# Altium integrated library myIOT_lib.IntLib: 300 symbols (part 2 of 3) (continued)
## TXB0104 (continued)

## TXB0108PWR
designator U?
IC TXB0108PWR 8 bits Logic Translator TSSOP-20; Anunda_Code: M1405; Value: TXB0108PWR
footprint TSSOP20
pins: 1 A1 (io), 2 VCCA, 3 A2 (io), 4 A3 (io), 5 A4 (io), 6 A5 (io), 7 A6 (io), 8 A7 (io), 9 A8 (io), 10 OE (in), 11 GND, 12 B8 (io), 13 B7 (io), 14 B6 (io), 15 B5 (io), 16 B4 (io), 17 B3 (io), 18 B2 (io), 19 VCCB, 20 B1 (io)

## TXS0104E
designator U?, comment TXS0104EPWR
TXS0104E 4-Bit Bidirectional Voltage-Level Translator for Open-Drain and Push-Pull / Applications; Anunda_Code: M2024; MFG: Texas Instruments; Value: TXS0104EPWR; MFG P/N: TXS0104EPWR
footprint TSSOP14
pins: 1 VCCA, 2 A1 (io), 3 A2 (io), 4 A3 (io), 5 A4 (io), 6 NC, 7 GND, 8 OE (in), 9 NC, 10 B4 (io), 11 B3 (io), 12 B2 (io), 13 B1 (io), 14 VCCB

## TXS0108EPWR
designator U?
IC TXS0108EPWR 8 bits Logic Translator TSSOP-20; Anunda_Code: M2005; Value: TXS0108EPWR
footprint TSSOP20
pins: 1 A1 (io), 2 VCCA, 3 A2 (io), 4 A3 (io), 5 A4 (io), 6 A5 (io), 7 A6 (io), 8 A7 (io), 9 A8 (io), 10 OE (in), 11 GND, 12 B8 (io), 13 B7 (io), 14 B6 (io), 15 B5 (io), 16 B4 (io), 17 B3 (io), 18 B2 (io), 19 VCCB, 20 B1 (io)

## W25Q16JVSSIQ
designator U?
NOR-SPI Flash Winbond W25Q16JVSSIQ Power Supply 2.7V to 3.6V; Anunda_Code: D1143; MFG: Winbond Electronics; MFG P/N: W25Q16JVSSIQ
footprint SOIC-8_208mil
pins: 1 CS# (in), 2 SO/SIO1 (io), 3 WP#/SIO2 (io), 4 GND, 5 SI/SIO0 (io), 6 SCLK (in), 7 RESET#/SIO3 (io), 8 VCC (power)

## ZED_F9P
designator U?  (value not drawn)
footprint UBlox_ZED
part A pins: 2 RF IN, 4 ANT DETECT (in), 5 ANT OFF (out), 6 ~{ANT SHORT} (in), 19 GEOFENCE STAT (out), 20 RTK STAT (out), 26 RXD2 (in), 27 TXD2 (out), 39 USB DM (io), 40 USB DP (io), 42 TXD/SPI MISO (out), 43 RXD/SPI MOSI (in), 44 SDA/~{SPI CS} (io), 45 SCL/SPI CLK (io), 46 TX READY (out), 47 D SEL (in), 49 ~{RESET} (in), 50 ~{SAFEBOOT} (in), 51 EXTINT (in), 53 TIMEPULSE (out)
part B pins: 7 VCC RF (power), 8 Reserved, 9 Reserved, 10 Reserved, 11 Reserved, 13 Reserved, 15 Reserved, 16 Reserved, 17 Reserved, 18 Reserved, 21 Reserved, 22 Reserved, 23 Reserved, 24 Reserved, 25 Reserved, 28 Reserved, 29 Reserved, 30 Reserved, 31 Reserved, 33 VCC (power), 34 VCC (power), 35 Reserved, 36 V BCKP (power), 38 V USB (power), 52 Reserved, 54 Reserved
part C pins: 1 GND (power), 3 GND (power), 12 GND (power), 14 GND (power), 32 GND (power), 37 GND (power), 41 GND (power), 48 GND (power), 55 GND (power), 56 GND (power), 57 GND (power), 58 GND (power), 59 GND (power), 60 GND (power), 61 GND (power), 62 GND (power), 63 GND (power), 64 GND (power), 65 GND (power), 66 GND (power), 67 GND (power), 68 GND (power), 69 GND (power), 70 GND (power), 71 GND (power), 72 GND (power), 73 GND (power), 74 GND (power), 75 GND (power), 76 GND (power), 77 GND (power), 78 GND (power), 79 GND (power), 80 GND (power), 81 GND (power), 82 GND (power), 83 GND (power), 84 GND (power), 85 GND (power), 86 GND (power), 87 GND (power), 88 GND (power), 89 GND (power), 90 GND (power), 91 GND (power), 92 GND (power), 93 GND (power), 94 GND (power), 95 GND (power), 96 GND (power), 97 GND (power), 98 GND (power), 99 GND (power), 100 GND (power), 101 GND (power), 102 GND (power)


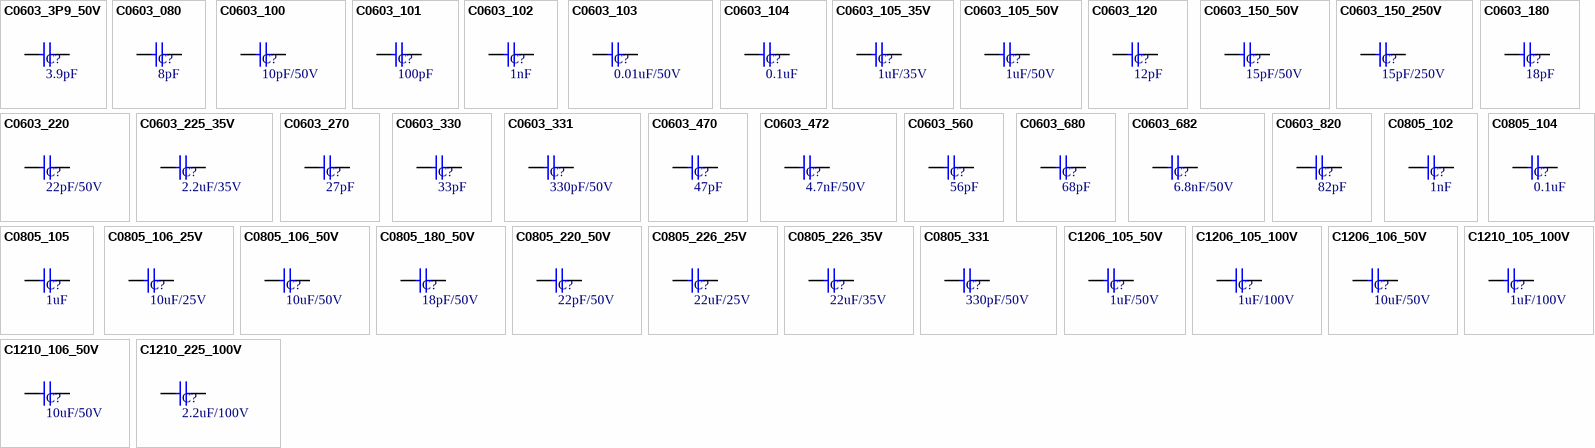
[diagram p12: symbols C0603_3P9_50V to C1210_225_100V]

## C0603_3P9_50V
designator C?, comment 3.9pF
Capacitor 0603 3.9 pF 50V; MFG: Walsin Technology Corporation; MFG P/N: 0603N3R9B500CT; Anunda_Code: M0013; Price: 0.6; Supplier: Digikey; Value: 3.9pF
simulation model CAP (Semiconductor Capacitor)
signal-integrity model Cap Semi
footprint C0603XS (Chip Capacitor; Body 1.6 x 0.8 mm (LxW typ))
pins: 1, 2

## C0603_080
designator C?, comment 8pF
Capacitor 0603 8 pF; MFG: YAGEO; MFG P/N: CC0603DRNPO9BN8R0; Anunda_Code: M1855; Price: 0.6; Supplier: Digikey; Value: 8pF
simulation model CAP (Semiconductor Capacitor)
signal-integrity model Cap Semi
footprint C0603XS (Chip Capacitor; Body 1.6 x 0.8 mm (LxW typ))
pins: 1, 2

## C0603_100
designator C?, comment 10pF/50V
Capacitor 0603 10 pF 50V; MFG: KEMET; MFG P/N: C0603C100J5GAC7867; Anunda_Code: M0615; Price: 0.6; Supplier: Digikey; Value: 10pF/50V
simulation model CAP (Semiconductor Capacitor)
signal-integrity model Cap Semi
footprint C0603XS (Chip Capacitor; Body 1.6 x 0.8 mm (LxW typ))
pins: 1, 2

## C0603_101
designator C?, comment 100pF
Capacitor 0603 100 pF; MFG: TDK Corporation; MFG P/N: C1608C0G1H101J080AA; Anunda_Code: M0016; Price: 0.6; Supplier: Digikey; Value: 100pF
simulation model CAP (Semiconductor Capacitor)
signal-integrity model Cap Semi
footprint C0603XS (Chip Capacitor; Body 1.6 x 0.8 mm (LxW typ))
pins: 1, 2

## C0603_102
designator C?, comment 1nF
Capacitor 0603 1000 pF; MFG: KEMET; MFG P/N: C0603C102J5GAC7867; Anunda_Code: M0617; Price: 0.6; Supplier: Digikey; Value: 1nF
simulation model CAP (Semiconductor Capacitor)
signal-integrity model Cap Semi
footprint C0603XS (Chip Capacitor; Body 1.6 x 0.8 mm (LxW typ))
pins: 1, 2

## C0603_103
designator C?, comment 0.01uF/50V
Capacitor 0603 10000 pF 50V; MFG: YAGEO; MFG P/N: CC0603KRX7R9BB103; Anunda_Code: M0735; Price: 0.6; Supplier: Digikey; Value: 0.01uF/50V
simulation model CAP (Semiconductor Capacitor)
signal-integrity model Cap Semi
footprint C0603XS (Chip Capacitor; Body 1.6 x 0.8 mm (LxW typ))
pins: 1, 2

## C0603_104
designator C?, comment 0.1uF
Capacitor 0603 0.1 uF; MFG: YAGEO; MFG P/N: CC0603ZRY5V9BB104; Anunda_Code: M0020; Price: 0.6; Supplier: Digikey; Value: 0.1uF
simulation model CAP (Semiconductor Capacitor)
signal-integrity model Cap Semi
footprint C0603XS (Chip Capacitor; Body 1.6 x 0.8 mm (LxW typ))
pins: 1, 2

## C0603_105_35V
designator C?, comment 1uF/35V
Capacitor 0603 1 uF 35V X5R; MFG: TDK Corporation; MFG P/N: C1608X5R1V105K080AB; Anunda_Code: M0618; Price: 0.6; Supplier: Digikey; Value: 1uF/35V
simulation model CAP (Semiconductor Capacitor)
signal-integrity model Cap Semi
footprint C0603XS (Chip Capacitor; Body 1.6 x 0.8 mm (LxW typ))
pins: 1, 2

## C0603_105_50V
designator C?, comment 1uF/50V
Capacitor 0603 1 uF 50V X5R; MFG: Murata Electronics; MFG P/N: GRT188R61H105KE13D; Anunda_Code: M1942; Price: 0.6; Supplier: Digikey; Value: 1uF/50V
simulation model CAP (Semiconductor Capacitor)
signal-integrity model Cap Semi
footprint C0603XS (Chip Capacitor; Body 1.6 x 0.8 mm (LxW typ))
pins: 1, 2

## C0603_120
designator C?, comment 12pF
Capacitor 0603 12 pF; MFG: KEMET; MFG P/N: C0603C120J5GAC7867; Anunda_Code: M0015; Price: 0.6; Supplier: Digikey; Value: 12pF
simulation model CAP (Semiconductor Capacitor)
signal-integrity model Cap Semi
footprint C0603XS (Chip Capacitor; Body 1.6 x 0.8 mm (LxW typ))
pins: 1, 2

## C0603_150_50V
designator C?, comment 15pF/50V
Capacitor 0603 15 pF 50V; MFG: YAGEO; MFG P/N: CC0603JRNPO9BN150; Anunda_Code: M1421; Price: 0.6; Supplier: Digikey; Value: 15pF/50V
simulation model CAP (Semiconductor Capacitor)
signal-integrity model Cap Semi
footprint C0603XS (Chip Capacitor; Body 1.6 x 0.8 mm (LxW typ))
pins: 1, 2

## C0603_150_250V
designator C?, comment 15pF/250V
Capacitor 0603 15 pF 250V; MFG: YAGEO; MFG P/N: AC0603JRNPOYBN150; Anunda_Code: M0988; Price: 0.6; Supplier: Digikey; Value: 15pF/250V
simulation model CAP (Semiconductor Capacitor)
signal-integrity model Cap Semi
footprint C0603XS (Chip Capacitor; Body 1.6 x 0.8 mm (LxW typ))
pins: 1, 2

## C0603_180
designator C?, comment 18pF
Capacitor 0603 18 pF; MFG: Murata Electronics; MFG P/N: GRM1885C1H180JA01D; Anunda_Code: M0660; Price: 0.6; Supplier: Digikey; Value: 18pF
simulation model CAP (Semiconductor Capacitor)
signal-integrity model Cap Semi
footprint C0603XS (Chip Capacitor; Body 1.6 x 0.8 mm (LxW typ))
pins: 1, 2

## C0603_220
designator C?, comment 22pF/50V
Capacitor 0603 22 pF 50V; MFG: TDK Corporation; MFG P/N: C1608C0G1H220J080AA; Anunda_Code: M0614; Price: 0.6; Supplier: Digikey; Value: 22pF/50V
simulation model CAP (Semiconductor Capacitor)
signal-integrity model Cap Semi
footprint C0603XS (Chip Capacitor; Body 1.6 x 0.8 mm (LxW typ))
pins: 1, 2

## C0603_225_35V
designator C?, comment 2.2uF/35V
Capacitor 0603 2.2 uF 35V X5R; MFG: Murata Electronics; MFG P/N: GRM188R6YA225KA12D; Anunda_Code: M1944; Price: 0.6; Supplier: Digikey; Value: 2.2uF/35V
simulation model CAP (Semiconductor Capacitor)
signal-integrity model Cap Semi
footprint C0603XS (Chip Capacitor; Body 1.6 x 0.8 mm (LxW typ))
pins: 1, 2

## C0603_270
designator C?, comment 27pF
Capacitor 0603 27 pF; MFG: KEMET; MFG P/N: C0603C270J5GAC7867; Anunda_Code: M0684; Price: 0.6; Supplier: Digikey; Value: 27pF
simulation model CAP (Semiconductor Capacitor)
signal-integrity model Cap Semi
footprint C0603XS (Chip Capacitor; Body 1.6 x 0.8 mm (LxW typ))
pins: 1, 2

## C0603_330
designator C?, comment 33pF
Capacitor 0603 33 pF; MFG: Murata Electronics; MFG P/N: GRM1885C1H330JA01D; Anunda_Code: M0923; Price: 0.6; Supplier: Digikey; Value: 33pF
simulation model CAP (Semiconductor Capacitor)
signal-integrity model Cap Semi
footprint C0603XS (Chip Capacitor; Body 1.6 x 0.8 mm (LxW typ))
pins: 1, 2

## C0603_331
designator C?, comment 330pF/50V
Capacitor 0603 330 pF 50V; MFG: Murata Electronics; MFG P/N: GRM1885C1H331JA01D; Anunda_Code: M0616; Price: 0.6; Supplier: Digikey; Value: 330pF/50V
simulation model CAP (Semiconductor Capacitor)
signal-integrity model Cap Semi
footprint C0603XS (Chip Capacitor; Body 1.6 x 0.8 mm (LxW typ))
pins: 1, 2

## C0603_470
designator C?, comment 47pF
Capacitor 0603 47 pF; MFG: Murata Electronics; MFG P/N: GRM1885C1H470JA01D; Anunda_Code: M1173; Price: 0.6; Supplier: Digikey; Value: 47pF
simulation model CAP (Semiconductor Capacitor)
signal-integrity model Cap Semi
footprint C0603XS (Chip Capacitor; Body 1.6 x 0.8 mm (LxW typ))
pins: 1, 2

## C0603_472
designator C?, comment 4.7nF/50V
Capacitor 0603 4700 pF 50V; MFG: Samsung Electro-Mechanics; MFG P/N: CL10B472KB8NNNC; Anunda_Code: M0726; Price: 0.6; Supplier: Digikey; Value: 4.7nF/50V
simulation model CAP (Semiconductor Capacitor)
signal-integrity model Cap Semi
footprint C0603XS (Chip Capacitor; Body 1.6 x 0.8 mm (LxW typ))
pins: 1, 2

## C0603_560
designator C?, comment 56pF
Capacitor 0603 56 pF; MFG: YAGEO; MFG P/N: CC0603JRNPO9BN560; Anunda_Code: M1539; Price: 0.6; Supplier: Digikey; Value: 56pF
simulation model CAP (Semiconductor Capacitor)
signal-integrity model Cap Semi
footprint C0603XS (Chip Capacitor; Body 1.6 x 0.8 mm (LxW typ))
pins: 1, 2

## C0603_680
designator C?, comment 68pF
Capacitor 0603 68 pF; MFG: Samsung Electro-Mechanics; MFG P/N: CL10C680JB8NNNC; Anunda_Code: M1400; Price: 0.6; Supplier: Digikey; Value: 68pF
simulation model CAP (Semiconductor Capacitor)
signal-integrity model Cap Semi
footprint C0603XS (Chip Capacitor; Body 1.6 x 0.8 mm (LxW typ))
pins: 1, 2

## C0603_682
designator C?, comment 6.8nF/50V
Capacitor 0603 6800 pF 50V; MFG: Walsin Technology Corporation; MFG P/N: 0603B682K500CT; Anunda_Code: M2163; Price: 0.6; Supplier: Digikey; Value: 6.8nF/50V
simulation model CAP (Semiconductor Capacitor)
signal-integrity model Cap Semi
footprint C0603XS (Chip Capacitor; Body 1.6 x 0.8 mm (LxW typ))
pins: 1, 2

## C0603_820
designator C?, comment 82pF
Capacitor 0603 82 pF; MFG: Samsung Electro-Mechanics; MFG P/N: CL10C820JB81PND; Anunda_Code: M1401; Price: 0.6; Supplier: Digikey; Value: 82pF
simulation model CAP (Semiconductor Capacitor)
signal-integrity model Cap Semi
footprint C0603XS (Chip Capacitor; Body 1.6 x 0.8 mm (LxW typ))
pins: 1, 2

## C0805_102
designator C?, comment 1nF
Capacitor 0805 1 nF; MFG: KEMET; MFG P/N: C0805C102K5RAC7800; Anunda_Code: M0021; Price: 0.6; Supplier: Digikey; Value: 1nF
simulation model CAP (Semiconductor Capacitor)
signal-integrity model Cap Semi
footprint C0805XS (Chip Capacitor;)
pins: 1, 2

## C0805_104
designator C?, comment 0.1uF
Capacitor 0805 0.1 uF; MFG: KEMET; MFG P/N: C0805C104K5RAC7800; Anunda_Code: M0022; Price: 0.6; Supplier: Digikey; Value: 0.1uF
simulation model CAP (Semiconductor Capacitor)
signal-integrity model Cap Semi
footprint C0805XS (Chip Capacitor;)
pins: 1, 2

## C0805_105
designator C?, comment 1uF
Capacitor 0805 1 uF; MFG: Samsung Electro-Mechanics; MFG P/N: CL21A105KBCLNNC; Anunda_Code: M1084; Price: 0.6; Supplier: Digikey; Value: 1uF
simulation model CAP (Semiconductor Capacitor)
signal-integrity model Cap Semi
footprint C0805XS (Chip Capacitor;)
pins: 1, 2

## C0805_106_25V
designator C?, comment 10uF/25V
Capacitor 0805 10 uF 25V; MFG: Samsung Electro-Mechanics; MFG P/N: CL21A106KAYNNNE; Anunda_Code: M1424; Price: 0.6; Supplier: Digikey; Value: 10uF/25V
simulation model CAP (Semiconductor Capacitor)
signal-integrity model Cap Semi
footprint C0805XS (Chip Capacitor;)
pins: 1, 2

## C0805_106_50V
designator C?, comment 10uF/50V
Capacitor 0805 10 uF 50V; MFG: Murata Electronics; MFG P/N: GRM21BR61H106KE43L; Anunda_Code: M0037; Price: 0.6; Supplier: Digikey; Value: 10uF/50V
simulation model CAP (Semiconductor Capacitor)
signal-integrity model Cap Semi
footprint C0805XS (Chip Capacitor;)
pins: 1, 2

## C0805_180_50V
designator C?, comment 18pF/50V
Capacitor 0805 18 pF 50V; MFG: YAGEO; MFG P/N: CC0805JRNPO9BN180; Anunda_Code: M0035; Price: 0.6; Supplier: Digikey; Value: 18pF/50V
simulation model CAP (Semiconductor Capacitor)
signal-integrity model Cap Semi
footprint C0805XS (Chip Capacitor;)
pins: 1, 2

## C0805_220_50V
designator C?, comment 22pF/50V
Capacitor 0805 22 pF 50V; MFG: KYOCERA AVX; MFG P/N: 08055A220JAT2A; Anunda_Code: M0036; Price: 0.6; Supplier: Digikey; Value: 22pF/50V
simulation model CAP (Semiconductor Capacitor)
signal-integrity model Cap Semi
footprint C0805XS (Chip Capacitor;)
pins: 1, 2

## C0805_226_25V
designator C?, comment 22uF/25V
Capacitor 0805 22 uF 25V; MFG: Samsung Electro-Mechanics; MFG P/N: CL21A226MAYNNNE; Anunda_Code: M1711; Price: 0.6; Supplier: Digikey; Value: 22uF/25V
simulation model CAP (Semiconductor Capacitor)
signal-integrity model Cap Semi
footprint C0805XS (Chip Capacitor;)
pins: 1, 2

## C0805_226_35V
designator C?, comment 22uF/35V
Capacitor 0805 22 uF 35V; MFG: TDK Corporation; MFG P/N: C2012X5R1V226M125AC; Anunda_Code: M1707; Price: 0.6; Supplier: Digikey; Value: 22uF/35V
simulation model CAP (Semiconductor Capacitor)
signal-integrity model Cap Semi
footprint C0805XS (Chip Capacitor;)
pins: 1, 2

## C0805_331
designator C?, comment 330pF/50V
Capacitor 0805 330 pF 50V; MFG: KEMET; MFG P/N: C0805C331J5GAC7800; Anunda_Code: M0031; Price: 0.6; Supplier: Digikey; Value: 330pF/50V
simulation model CAP (Semiconductor Capacitor)
signal-integrity model Cap Semi
footprint C0805XS (Chip Capacitor;)
pins: 1, 2

## C1206_105_50V
designator C?, comment 1uF/50V
Capacitor 1206 1 uF 50V; MFG: Samsung Electro-Mechanics; MFG P/N: CL31B105KBHNFNE; Anunda_Code: M0038; Price: 0.6; Supplier: Digikey; Value: 1uF/50V
simulation model CAP (Semiconductor Capacitor)
signal-integrity model Cap Semi
footprint C1206
pins: 1, 2

## C1206_105_100V
designator C?, comment 1uF/100V
Capacitor 1206 1 uF 100V X7R; MFG: Samsung Electro-Mechanics; MFG P/N: CL31B105KCHNNNE; Anunda_Code: M2146; Price: 0.6; Supplier: Digikey; Value: 1uF/100V
simulation model CAP (Semiconductor Capacitor)
signal-integrity model Cap Semi
footprint C1206
pins: 1, 2

## C1206_106_50V
designator C?, comment 10uF/50V
Capacitor 1206 10 uF 50V; MFG: TDK Corporation; MFG P/N: C3216X5R1H106K160AB; Anunda_Code: M1093; Price: 0.6; Supplier: Digikey; Value: 10uF/50V
simulation model CAP (Semiconductor Capacitor)
signal-integrity model Cap Semi
footprint C1206
pins: 1, 2

## C1210_105_100V
designator C?, comment 1uF/100V
Capacitor 1210 1 uF 100V; MFG: Samsung Electro-Mechanics; MFG P/N: CL32B105KCJSNNE; Anunda_Code: M1088; Price: 0.6; Supplier: Digikey; Value: 1uF/100V
simulation model CAP (Semiconductor Capacitor)
signal-integrity model Cap Semi
footprint C1210
pins: 1, 2

## C1210_106_50V
designator C?, comment 10uF/50V
Capacitor 1210 10 uF 50V; MFG: Samsung Electro-Mechanics; MFG P/N: CL32B106KBJNNNE; Anunda_Code: M1047; Price: 0.6; Supplier: Digikey; Value: 10uF/50V
simulation model CAP (Semiconductor Capacitor)
signal-integrity model Cap Semi
footprint C1210
pins: 1, 2

## C1210_225_100V
designator C?, comment 2.2uF/100V
Capacitor SMD 1210 2.2 uF 100V 10% X7R; MFG: Samsung Electro-Mechanics; MFG P/N: CL32B225KCJSNNE; Anunda_Code: M1681; Price: 0.6; Supplier: Digikey; Value: 2.2uF/100V
simulation model CAP (Semiconductor Capacitor)
signal-integrity model Cap Semi
footprint C1210
pins: 1, 2

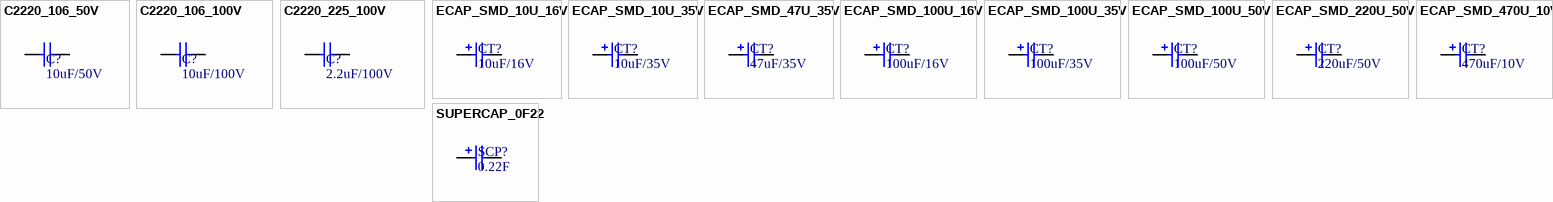
[diagram p13: symbols C2220_106_50V to SUPERCAP_0F22]

## C2220_106_50V
designator C?, comment 10uF/50V
Capacitor 2220 10 uF 50V; MFG: KYOCERA AVX; MFG P/N: 22205C106KAZ2A; Anunda_Code: M1134; Price: 0.6; Supplier: Digikey; Value: 10uF/50V
simulation model CAP (Semiconductor Capacitor)
signal-integrity model Cap Semi
footprint C2220 (Chip Capacitor, 2-Leads, Body 5.7x5.0mm, IPC Medium Density)
pins: 1, 2

## C2220_106_100V
designator C?, comment 10uF/100V
Capacitor 2220 10 uF 100V; MFG: KYOCERA AVX; MFG P/N: 22201C106MAT2A; Anunda_Code: M1641; Price: 0.6; Supplier: Digikey; Value: 10uF/100V
simulation model CAP (Semiconductor Capacitor)
signal-integrity model Cap Semi
footprint C2220 (Chip Capacitor, 2-Leads, Body 5.7x5.0mm, IPC Medium Density)
pins: 1, 2

## C2220_225_100V
designator C?, comment 2.2uF/100V
Capacitor 2220 2.2 uF 100V; MFG: TDK Corporation; MFG P/N: C5750X7R2A225M230KA; Anunda_Code: M1633; Price: 0.6; Supplier: Digikey; Value: 2.2uF/100V
simulation model CAP (Semiconductor Capacitor)
signal-integrity model Cap Semi
footprint C2220 (Chip Capacitor, 2-Leads, Body 5.7x5.0mm, IPC Medium Density)
pins: 1, 2

## ECAP_SMD_10U_16V
designator CT?, comment 10uF/16V
Capacitor SMD Electrolytic 10 uF 16V; MFG: Nichicon; MFG P/N: UWT1C100MCL1GB; Anunda_Code: M2064; Price: 5.06; Supplier: Jacky; Value: 10uF/16V
simulation model CAP (Capacitor)
signal-integrity model Cap Pol
footprint E-CAP4X5.4
pins: 1, 2
1 alternate drawing of the same symbol

## ECAP_SMD_10U_35V
designator CT?, comment 10uF/35V
Capacitor SMD Electrolytic 10 uF 35V; MFG: Nichicon; MFG P/N: UWT1V100MCL1GB; Anunda_Code: M0086; Price: 5.06; Supplier: Jacky; Value: 10uF/35V
simulation model CAP (Capacitor)
signal-integrity model Cap Pol
footprint E-CAP5x5.4 (Aluminum Electrolytic Capacitor, Body 5.30x5.30x5.40mm, IPC Medium Density)
pins: 1, 2
1 alternate drawing of the same symbol

## ECAP_SMD_47U_35V
designator CT?, comment 47uF/35V
Capacitor SMD Electrolytic 47 uF 35V; MFG: Nichicon; MFG P/N: UWT1V470MCL1GS; Anunda_Code: M0103; Price: 5.06; Supplier: ES; Value: 47uF/35V
simulation model CAP (Capacitor)
signal-integrity model Cap Pol
footprint E-CAP6.3X5.8 (Aluminum Electrolytic Capacitor, Body 6.60x6.60x6.30mm, IPC Medium Density)
pins: 1, 2
1 alternate drawing of the same symbol

## ECAP_SMD_100U_16V
designator CT?, comment 100uF/16V
Capacitor SMD Electrolytic 100 uF 16V; MFG: Nichicon; MFG P/N: UWX1C101MCL1GB; Anunda_Code: M1912; Price: 5.06; Supplier: Jacky; Value: 100uF/16V
simulation model CAP (Capacitor)
signal-integrity model Cap Pol
footprint E-CAP6.3X5.5 (Aluminum Electrolytic Capacitor, Body 6.60x6.60x5.50mm, IPC Medium Density)
pins: 1, 2
1 alternate drawing of the same symbol

## ECAP_SMD_100U_35V
designator CT?, comment 100uF/35V
Capacitor SMD Electrolytic 100 uF 35V; MFG: Nichicon; MFG P/N: UWT1H101MNL1GS; Anunda_Code: M1521; Price: 5.06; Supplier: ES; Value: 100uF/35V
simulation model CAP (Capacitor)
signal-integrity model Cap Pol
footprint E-CAP6.3X7.7 (Aluminum Electrolytic Capacitor, Body 6.60x6.60x7.70mm, IPC Medium Density)
pins: 1, 2
1 alternate drawing of the same symbol

## ECAP_SMD_100U_50V
designator CT?, comment 100uF/50V
Capacitor SMD Electrolytic 100 uF 50V; MFG: Nichicon; MFG P/N: UWT1H101MNL1GS; Anunda_Code: M0088; Price: 5.06; Supplier: ES; Value: 100uF/50V
simulation model CAP (Capacitor)
signal-integrity model Cap Pol
footprint E-CAP8X10 (Aluminum Electrolytic Capacitor, Body 8.30x8.30x10.80mm, IPC Medium Density)
pins: 1, 2
1 alternate drawing of the same symbol

## ECAP_SMD_220U_50V
designator CT?, comment 220uF/50V
Capacitor SMD Electrolytic 220 uF 50V; MFG: Nichicon; MFG P/N: UWT1H221MNL1GS; Anunda_Code: M2135; Price: 5.06; Supplier: ES; Value: 220uF/50V
simulation model CAP (Capacitor)
signal-integrity model Cap Pol
footprint E-CAP10X10 (Aluminum Electrolytic Capacitor, Body 10x10x10.80mm, IPC Medium Density)
pins: 1, 2
1 alternate drawing of the same symbol

## ECAP_SMD_470U_10V
designator CT?, comment 470uF/10V
Capacitor SMD Electrolytic 470 uF 10V; MFG: Nichicon; MFG P/N: UWT1A471MNL1GS; Anunda_Code: M1750; Price: 5.06; Supplier: Jacky; Value: 470uF/10V
simulation model CAP (Capacitor)
signal-integrity model Cap Pol
footprint E-CAP8X10 (Aluminum Electrolytic Capacitor, Body 8.30x8.30x10.80mm, IPC Medium Density)
pins: 1, 2
1 alternate drawing of the same symbol

## SUPERCAP_0F22
designator SCP?, comment 0.22F
Capacitor Radial Stacked Coin 0.22 F 5.5V Double Layer; MFG: Panasonic Electronic Components; MFG P/N: EECS0HD224V; Anunda_Code: D0733; Price: 5.06; Supplier: Jacky; Value: 0.22F
footprint SUPERCAP_5V5 (Supercap diameter 10mm height)
pins: 1, 2
1 alternate drawing of the same symbol


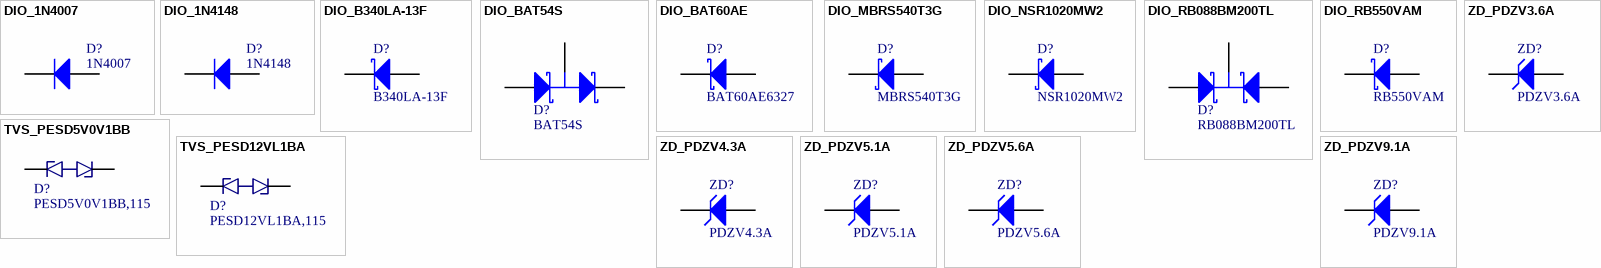
[diagram p14: symbols DIO_1N4007 to ZD_PDZV9.1A]

## DIO_1N4007
designator D?, comment 1N4007
Diode 1N4007 Rectifier  Axial, 1000V, 1A, TSC; Anunda_Code: M0329; MFG: Diodes Incorporated; MFG P/N: 1N4007-T; Published: 8-Jun-2000; LatestRevisionDate: 17-Jul-2002; LatestRevisionNote: Re-released for DXP Platform.; DatasheetVersion: 1997; PackageReference: DO-41; Publisher: Altium Limited; Value: 1N4007
signal-integrity model 1N4148
footprint DO-41 (Diode, Axial; Body 5.2 x 2.7 mm (LxDia. max), Lead Dia. 0.86 mm (max))
pins: 1 K, 2 A

## DIO_1N4148
designator D?, comment 1N4148
Diode 1N4148WS-7 Switch  SOD323 75V; Anunda_Code: M0334; MFG: Micro Commercial Components; MFG P/N: 1N4148WX-TP; Published: 8-Jun-2000; LatestRevisionDate: 17-Jul-2002; LatestRevisionNote: Re-released for DXP Platform.; DatasheetVersion: 1997; PackageReference: DO-35; Publisher: Altium Limited; Value: 1N4148
simulation model 1N4148 (DIODE)
signal-integrity model 1N4148
footprint SOD323
pins: 1 K, 2 A

## DIO_B340LA-13F
designator D?, comment B340LA-13F
Schottky Diode B340LA-13F; Published: 8-Jun-2000; LatestRevisionDate: 17-Jul-2002; LatestRevisionNote: Re-released for DXP Platform.; PackageReference: SMB; Publisher: Altium Limited; PackageDescription: DO-214-AA/SMB; 2 C-Bend Leads; Body 5.3 x 3.6 mm, inc. leads (LxW); Value: B340LA-13F
footprint SMA (DO-214AC Molded Diode, 2-Leads, Body 4.30x2.60mm, IPC Medium Density)
pins: 1 K, 2 A

## DIO_BAT54S
designator D?, comment BAT54S
Diode BAT54S Schottky Barrier Rectifier Diode 30V 200mA  SOT-23; Anunda_Code: M1880; MFG: Fairchild Semiconductor; MFG P/N: BAT54S_NL; Published: 17-Sep-2003; LatestRevisionDate: 12-Dec-2006; LatestRevisionNote: IPC-7351 Footprint Added.; DatasheetVersion: 4-Mar-2002; PackageVersion: May-1999; PackageReference: SOT23; Publisher: Altium Limited; PackageDescription: 3-Pin SOT-23 Package 0.95 mm Pitch, 2.3 mm Lead Span
footprint SOT23_N (SOT23, 3-Leads, Body 2.9x1.3mm, Pitch 0.95mm, Lead Span 2.3mm, IPC Medium Density)
footprint SOT23_L (SOT23, 3-Leads, Body 2.9x1.3mm, Pitch 0.95mm, Lead Span 2.3mm, IPC High Density)
footprint SOT23_M (SOT23, 3-Leads, Body 2.9x1.3mm, Pitch 0.95mm, Lead Span 2.3mm, IPC Low Density)
simulation model BAT54S (SUBCKT)
signal-integrity model BAT54S
footprint SOT23_N_2
pins: 1 A, 2 K, 3 C

## DIO_BAT60AE
designator D?, comment BAT60AE6327
BAT60AE6327INCT-ND Schottky Diode 10V 2A SOD-323; Note: Pin 2 is not connected and not drawn.; Anunda_Code: M1178; MFG: Infineon Technologies; MFG P/N: BAT60AE6327HTSA1; Published: 21-Mar-2003; LatestRevisionDate: 29-May-2009; LatestRevisionNote: IPC-7351 Footprint Added.; DatasheetVersion: Oct-1999; PackageVersion: Sep-2001; PackageReference: SOT-23; Publisher: Altium Limited; PackageDescription: 3-Pin SOT-23 Package 0.95 mm Pitch, 2.5 mm Lead Span; Value: BAT60AE6327
footprint SOD323
pins: 1 K, 2 A

## DIO_MBRS540T3G
designator D?, comment MBRS540T3G
DIODE MBRS540T3G SCHOTTKY 40V 5A; Anunda_Code: M2140; MFG: ON Semiconductor; Published: 8-Jun-2000; LatestRevisionDate: 17-Jul-2002; LatestRevisionNote: Re-released for DXP Platform.; PackageReference: SMB; Publisher: Altium Limited; PackageDescription: DO-214-AA/SMB; 2 C-Bend Leads; Body 5.3 x 3.6 mm, inc. leads (LxW); Value: MBRS540T3G; MFG P/N: MBRS540T3G
simulation model SKYDIODE (Diode)
signal-integrity model D Schottky
footprint DO-214AB (Molded Diode, 2-Leads, Body 6.88x5.90mm, IPC Medium Density)
pins: 1 K, 2 A

## DIO_NSR1020MW2
designator D?, comment NSR1020MW2
Schottky Diode NSR1020MW2; Published: 8-Jun-2000; LatestRevisionDate: 17-Jul-2002; LatestRevisionNote: Re-released for DXP Platform.; PackageReference: SMB; Publisher: Altium Limited; PackageDescription: DO-214-AA/SMB; 2 C-Bend Leads; Body 5.3 x 3.6 mm, inc. leads (LxW); Value: NSR1020MW2
footprint SOD323
pins: 1 K, 2 A

## DIO_RB088BM200TL
designator D?, comment RB088BM200TL
DIODE SCHOTTKY RB088BM200TL 200V REVERSE 10A; Anunda_Code: M2138; MFG: Rohm Semiconductor; Published: 17-Sep-2003; LatestRevisionDate: 12-Dec-2006; LatestRevisionNote: IPC-7351 Footprint Added.; DatasheetVersion: 4-Mar-2002; PackageVersion: May-1999; PackageReference: TO252; Publisher: Altium Limited; PackageDescription: DPAK TO-252; MFG P/N: RB088BM200TL
footprint TO-252 (D-PAK, 3-Pads, Body 6.4x6.8mm (max), IPC Medium Density)
pins: 1 A1, 2 K, 3 A2

## DIO_RB550VAM
designator D?, comment RB550VAM
Schottky Diode RB550VAM; Anunda_Code: M1913; MFG: Rohm Semiconductor; MFG P/N: RB550VAM-30TR; Published: 8-Jun-2000; LatestRevisionDate: 17-Jul-2002; LatestRevisionNote: Re-released for DXP Platform.; PackageReference: SMB; Publisher: Altium Limited; PackageDescription: DO-214-AA/SMB; 2 C-Bend Leads; Body 5.3 x 3.6 mm, inc. leads (LxW); Value: RB550VAM
simulation model SKYDIODE (Diode)
signal-integrity model D Schottky
footprint SOD323HE
pins: 1 K, 2 A

## TVS_PESD5V0V1BB
designator D?, comment PESD5V0V1BB,115
ESD PESD5V0V1BB,115  SOD523; Anunda_Code: M1438; MFG: Nexperia USA Inc.; MFG P/N: PESD5V0V1BB,115; Value: PESD5V0V1BB,115
footprint SOD523
pins: 1 cathode1, 2 cathode2

## TVS_PESD12VL1BA
designator D?, comment PESD12VL1BA,115
ESD PESD12VL1BA,115  SOD323; Anunda_Code: M2032; MFG: Nexperia USA Inc.; MFG P/N: PESD12VL1BA,115; Value: PESD12VL1BA,115
footprint SOD323
pins: 1 cathode1, 2 cathode2

## ZD_PDZV3.6A
designator ZD?, comment PDZV3.6A
PDZV3.6A  Zener Diode 3.6V 1W ฑ6.19% Surface Mount PMDTM; Anunda_Code: M1967; MFG: Rohm Semiconductor; MFG P/N: PDZVTR3.6A; Published: 8-Jun-2000; LatestRevisionDate: 17-Jul-2002; LatestRevisionNote: Re-released for DXP Platform.; PackageReference: DIODE-0.7; Publisher: Altium Limited; PackageDescription: Diode, Thru-Hole; 2 Leads; 0.7 in Pin Spacing; Digi-Key: PDZVTR3.6ACT-ND
footprint SOD-128 (SODFL, 2-Leads, Body 2.50x4.70mm, IPC Medium Density)
pins: 1 K, 2 A

## ZD_PDZV4.3A
designator ZD?, comment PDZV4.3A
PDZV4.3A  Zener Diode 4.3V 1W ฑ6.19% Surface Mount PMDTM; Anunda_Code: M2001; MFG: Rohm Semiconductor; MFG P/N: PDZVTR4.3A; Published: 8-Jun-2000; LatestRevisionDate: 17-Jul-2002; LatestRevisionNote: Re-released for DXP Platform.; PackageReference: DIODE-0.7; Publisher: Altium Limited; PackageDescription: Diode, Thru-Hole; 2 Leads; 0.7 in Pin Spacing; Digi-Key: PDZVTR4.3ACT-ND
footprint SOD-128 (SODFL, 2-Leads, Body 2.50x4.70mm, IPC Medium Density)
pins: 1 K, 2 A

## ZD_PDZV5.1A
designator ZD?, comment PDZV5.1A
PDZV5.1A  Zener Diode 5.1V 1W ฑ6.19% Surface Mount PMDTM; Anunda_Code: M1926; MFG: Rohm Semiconductor; MFG P/N: PDZVTR5.1A; Published: 8-Jun-2000; LatestRevisionDate: 17-Jul-2002; LatestRevisionNote: Re-released for DXP Platform.; PackageReference: DIODE-0.7; Publisher: Altium Limited; PackageDescription: Diode, Thru-Hole; 2 Leads; 0.7 in Pin Spacing; Digi-Key: PDZVTR5.1ACT-ND
footprint SOD-128 (SODFL, 2-Leads, Body 2.50x4.70mm, IPC Medium Density)
pins: 1 K, 2 A

## ZD_PDZV5.6A
designator ZD?, comment PDZV5.6A
Diode PDZVTR5.6A Zener 5.65V 1W SOD-128; Anunda_Code: M1923; MFG: Rohm Semiconductor; Published: 8-Jun-2000; LatestRevisionDate: 17-Jul-2002; LatestRevisionNote: Re-released for DXP Platform.; PackageReference: DIODE-0.7; Publisher: Altium Limited; PackageDescription: Diode, Thru-Hole; 2 Leads; 0.7 in Pin Spacing; Digi-Key: PDZVTR5.6ACT-ND; MFG P/N: PDZVTR5.6A
footprint SOD-128 (SODFL, 2-Leads, Body 2.50x4.70mm, IPC Medium Density)
pins: 1 K, 2 A

## ZD_PDZV9.1A
designator ZD?, comment PDZV9.1A
PDZV9.1A  Zener Diode 9.1V 1W ฑ6.19% Surface Mount PMDTM; Anunda_Code: M1925; MFG: Rohm Semiconductor; MFG P/N: PDZVTR9.1A; Published: 8-Jun-2000; LatestRevisionDate: 17-Jul-2002; LatestRevisionNote: Re-released for DXP Platform.; PackageReference: DIODE-0.7; Publisher: Altium Limited; PackageDescription: Diode, Thru-Hole; 2 Leads; 0.7 in Pin Spacing; Digi-Key: PDZVTR9.1ACT-ND
footprint SOD-128 (SODFL, 2-Leads, Body 2.50x4.70mm, IPC Medium Density)
pins: 1 K, 2 A


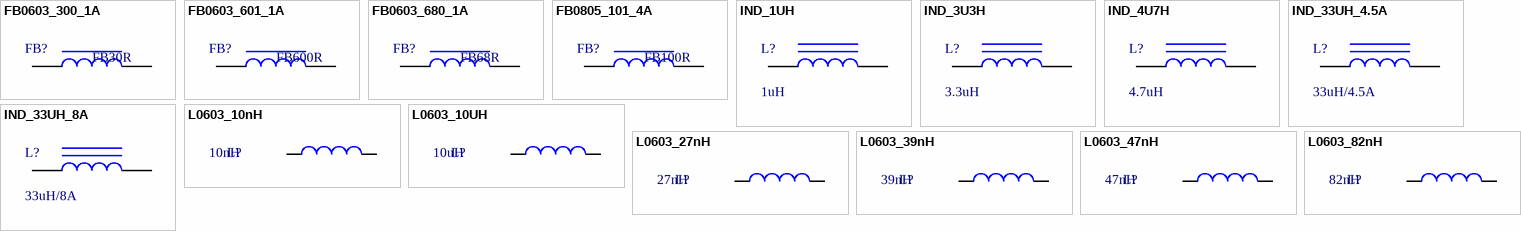
[diagram p15: symbols FB0603_300_1A to L0603_82nH]

## FB0603_300_1A
designator FB?, comment FB30R
Ferrite SMD 0603 30 Ohm 1000MA BLM18PG300SN1D Murata; Anunda_code: M0646; MFG: Wurth Elektronik; MFG P/N: 742792609; Value: FB30R; Code_JEITA: 0603
signal-integrity model Inductor Iron Dot
footprint FB0603 (Chip FB 0603)
pins: 1, 2

## FB0603_601_1A
designator FB?, comment FB600R
Ferrite Bead SMD 0603 600 Ohm MPZ1608S601A TDK; Anunda_code: M0647; MFG: TDK Corporation; MFG P/N: MPZ1608S601ATA00; Value: FB600R; Code_JEITA: 0603
signal-integrity model Inductor Iron Dot
footprint FB0603 (Chip FB 0603)
pins: 1, 2

## FB0603_680_1A
designator FB?, comment FB68R
Ferrite SMD 0603 68 Ohm 1A MI0603J680Rm10; Anunda_code: M0645; MFG: Laird-Signal Integrity Products; MFG P/N: MI0603J680R-10; Value: FB68R; Code_JEITA: 0603
signal-integrity model Inductor Iron Dot
footprint FB0603 (Chip FB 0603)
pins: 1, 2

## FB0805_101_4A
designator FB?, comment FB100R
Chip Beads for Power Line 100 Ohm 25%, / Rate Current 4A / DCR 0.02 Ohm; Anunda_code: M0524; MFG: TDK Corporation; MFG P/N: MPZ2012S101AT; Value: FB100R; Code_JEITA: 0805
signal-integrity model Inductor Iron Dot
footprint FB0805 (Chip FB 0805 ;)
pins: 1, 2

## IND_1UH
designator L?, comment 1uH
Inductor Fixed Power 1uH 3A 30 mOhm 1212 SMD; Anunda_Code: M1918; MFG: Murata Electronics; MFG P/N: LQH3NPN1R0MMEL; Value: 1uH; Code_JEITA: 1212
footprint INDP3030X15N (Precision Wire Wound Inductor, 2-Leads, Body 3.00x3.00mm, IPC Medium Density)
pins: 1, 2

## IND_3U3H
designator L?, comment 3.3uH
Inductor Fixed Power 3.3uH; Anunda_Code: D1093; MFG: Taiyo Yuden; MFG P/N: NRS5040T3R3NMGJ; Value: 3.3uH; Code_JEITA: 2020
footprint INDP4949X31N (Precision Wire Wound Inductor, 2-Leads, Body 4.90x4.90mm, IPC Medium Density)
pins: 1, 2

## IND_4U7H
designator L?, comment 4.7uH
Inductor Fixed Power 4.7uH 980mA 0.117 Ohm; Anunda_Code: M1952; MFG: Murata Electronics; MFG P/N: LQH44PN4R7MJ0L; Value: 4.7uH; Code_JEITA: 1616
footprint INDP4040X12N (Precision Wire Wound Inductor, 2-Leads, Body 4.00x4.00mm, IPC Medium Density)
pins: 1, 2

## IND_33UH_4.5A
designator L?, comment 33uH/4.5A
INDUCTOR SMD 33 UH 4.5A POWER CHOKE; Anunda_Code: M2136; MFG: CODACA; MFG P/N: SPRHS125-330M; Value: 33uH/4.5A
footprint INDP120120X67N (Precision Wire Wound Inductor, 2-Leads, Body 12.00x12.00mm, IPC Medium Density)
pins: 1, 2

## IND_33UH_8A
designator L?, comment 33uH/8A
INDUCTOR SMD SHIELD 33 UH 8A 56MOHM; Anunda_Code: M2147; MFG: Bourns Inc.; MFG P/N: SRP1265C-330M; Value: 33uH/8A
footprint INDP126126X65N (Precision Wire Wound Inductor, 2-Leads, Body 12.60x12.60mm, IPC Medium Density)
pins: 1, 2

## L0603_10nH
designator L?, comment 10nH
Inductor SMD 0603 10 nH 650 mA WW Ceramic; Anunda_code: M1435; MFG: Murata Electronics; MFG P/N: LQW18AN10NJ00D; Code_JEITA: 0603; Value: 10nH
simulation model INDUCTOR (Inductor)
signal-integrity model Inductor
footprint L0603XS (Chip Inductor; Body 1.6 x 0.8 mm (LxW typ))
pins: 1, 2

## L0603_10UH
designator L?, comment 10uH
Inductor smd 0603 10uH; Anunda_code: M1179; MFG: TDK Corporation; MFG P/N: MLZ1608M100WT000; Code_JEITA: 0603; Value: 10uH
simulation model INDUCTOR (Inductor)
signal-integrity model Inductor
footprint L0603XS (Chip Inductor; Body 1.6 x 0.8 mm (LxW typ))
pins: 1, 2

## L0603_27nH
designator L?, comment 27nH
Inductor SMD 0603 27 nH 600 mA WW; Anunda_code: M1717; MFG: Bourns Inc.; MFG P/N: CW160808-27NJ; Code_JEITA: 0603; Value: 27nH
simulation model INDUCTOR (Inductor)
signal-integrity model Inductor
footprint L0603XS (Chip Inductor; Body 1.6 x 0.8 mm (LxW typ))
pins: 1, 2

## L0603_39nH
designator L?, comment 39nH
Inductor smd 0603 39 nH; Anunda_code: M1043; MFG: Bourns Inc.; MFG P/N: PM0603-39NJ-RC; Code_JEITA: 0603; Value: 39nH
simulation model INDUCTOR (Inductor)
signal-integrity model Inductor
footprint L0603XS (Chip Inductor; Body 1.6 x 0.8 mm (LxW typ))
pins: 1, 2

## L0603_47nH
designator L?, comment 47nH
Inductor smd 0603 47 nH; Anunda_code: M1748; MFG: Pulse Electronics; MFG P/N: BSCH0016080847NJ00; Code_JEITA: 0603; Value: 47nH
simulation model INDUCTOR (Inductor)
signal-integrity model Inductor
footprint L0603XS (Chip Inductor; Body 1.6 x 0.8 mm (LxW typ))
pins: 1, 2

## L0603_82nH
designator L?, comment 82nH
Inductor smd 0603 82 nH; Anunda_code: M1034; MFG: Abracon LLC; MFG P/N: AISC-0603-R082J-T; Code_JEITA: 0603; Value: 82nH
simulation model INDUCTOR (Inductor)
signal-integrity model Inductor
footprint L0603XS (Chip Inductor; Body 1.6 x 0.8 mm (LxW typ))
pins: 1, 2


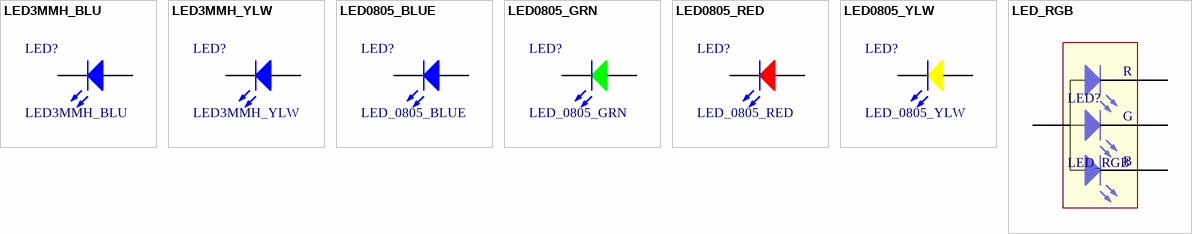
[diagram p16: symbols LED3MMH_BLU to LED_RGB]

## LED3MMH_BLU
designator LED?
LED Housing Dia = 3mm BLUE, 450mcd; MFG: Ligitek; MFG P/N: LA16B/DBK-2-PF; Anunda_Code: D0903; Price: 1.65; Supplier: ES; Value: LED3MMH_BLU
simulation model LED3 (Diode)
footprint LED-BLU (Typical INFRARED GaAs LED; 2 Leads)
pins: 1 K, 2 A

## LED3MMH_YLW
designator LED?
LED Housing Dia = 3mm YELLOW, 220mcd; MFG: Ligitek; MFG P/N: LA16B/VY-2-PF; Anunda_Code: D0904; Price: 1.65; Supplier: ES; Value: LED3MMH_YLW
simulation model LED3 (Diode)
footprint LED-YLW (Typical INFRARED GaAs LED; 2 Leads)
pins: 1 K, 2 A

## LED0805_BLUE
designator LED?, comment LED_0805_BLUE
LED TO-2013BC-BF SMD Blue Water Clear 146 MCD; MFG: Oasistek; Anunda_Code: M2091; MFG P/N: TO-2013BC-BF; Price: 2.26; Supplier: ES; Value: LED_0805_BLUE
simulation model LED3 (Diode)
footprint LED-0805_BLU (Chip LED0805 ; BLUE)
footprint 0805_LED_S1 - BLU
pins: 1 K, 2 A

## LED0805_GRN
designator LED?, comment LED_0805_GRN
LED TO-2013BC-MGE SMD Green water clear 146 MCD; MFG: Oasistek; Anunda_Code: M1915; MFG P/N: TO-2013BC-MGE; Price: 1.65; Supplier: ES; Value: LED_0805_GRN
simulation model LED3 (Diode)
footprint LED-0805_GRN (Chip LED0805 ; GREEN)
footprint 0805_LED_S1 - GRN
pins: 1 K, 2 A

## LED0805_RED
designator LED?, comment LED_0805_RED
LED; MFG: Oasistek; MFG P/N: TO-2013BC-MRE; Price: 2.26; Supplier: ES; Value: LED_0805_RED
simulation model LED3 (Diode)
footprint LED-0805_RED (Chip LED0805 ; RED)
footprint 0805_LED_S1 - RED
pins: 1 K, 2 A

## LED0805_YLW
designator LED?, comment LED_0805_YLW
LED TO-2013BC-MYE SMD Yellow water clear 146 MCD; MFG: Oasistek; Anunda_Code: M1916; MFG P/N: TO-2013BC-MYE; Price: 1.65; Supplier: ES; Value: LED_0805_YLW
simulation model LED3 (Diode)
footprint LED-0805_YLW (Chip LED0805 ; YELLOW)
footprint 0805_LED_S1 - YLW
pins: 1 K, 2 A